# Altium schematic symbol library jlcpcb_2025_04_inductors_extended_0402.schlib: 1396 symbols (part 2 of 8) (continued)
## LQG15HN2N4S02D
designator L?  Inductance: 2.4nH
Inductor, 2.4nH, 100mΩ, 800mA, SMD 0402; Manufacturer: Murata Electronics; Manufacturer Part Number: LQG15HN2N4S02D; Self-Resonant Frequency: 6GHz; Q Factor: 8@100MHz; Package Size: 0402; JLCPCB Basic Part: No; JLCPCB Part Number: C913678; Supplier 1: LCSC; Category: Inductors; Supplier Part Number 1: C913678; Rated Current: 800mA; DC Resistance: 100mΩ; RoHS: Yes; ComponentLink1Description: Datasheet; ComponentLink1URL: https://wmsc.lcsc.com/wmsc/upload/file/pdf/v2/lcsc/2012102243_Murata-Electronics-LQG15HN2N4S02D_C913678.pdf; ComponentLink2Description: JLCPCB Part URL; ComponentLink2URL: https://jlcpcb.com/partdetail/C913678; ComponentLink3Description: LCSC Part URL; ComponentLink3URL: https://lcsc.com/product-detail/Inductors-SMD_Murata-Electronics-Murata-Electronics-LQG15HN2N4S02D_C913678.html
footprint IND-0402 (0402 (1005M) Inductor)
pins: 1, 2

## LQG15HN2N7C02D
designator L?  Inductance: 2.7nH
Inductor, 2.7nH, 100mΩ, 800mA, SMD 0402; Manufacturer: Murata Electronics; Manufacturer Part Number: LQG15HN2N7C02D; Self-Resonant Frequency: 6GHz; Q Factor: 8@100MHz; Package Size: 0402; JLCPCB Basic Part: No; JLCPCB Part Number: C1330739; Supplier 1: LCSC; Category: Inductors; Supplier Part Number 1: C1330739; Rated Current: 800mA; DC Resistance: 100mΩ; RoHS: Yes; ComponentLink1Description: Datasheet; ComponentLink1URL: https://wmsc.lcsc.com/wmsc/upload/file/pdf/v2/lcsc/2304140030_Murata-Electronics-LQG15HN2N7C02D_C1330739.pdf; ComponentLink2Description: JLCPCB Part URL; ComponentLink2URL: https://jlcpcb.com/partdetail/C1330739; ComponentLink3Description: LCSC Part URL; ComponentLink3URL: https://lcsc.com/product-detail/Inductors-SMD_Murata-Electronics-Murata-Electronics-LQG15HN2N7C02D_C1330739.html
footprint IND-0402 (0402 (1005M) Inductor)
pins: 1, 2

## LQG15HN2N7S02D
designator L?  Inductance: 2.7nH
Inductor, 2.7nH, 100mΩ, 800mA, SMD 0402; Manufacturer: Murata Electronics; Manufacturer Part Number: LQG15HN2N7S02D; Self-Resonant Frequency: 6GHz; Q Factor: 8@100MHz; Package Size: 0402; JLCPCB Basic Part: No; JLCPCB Part Number: C113054; Supplier 1: LCSC; Category: Inductors; Supplier Part Number 1: C113054; Rated Current: 800mA; DC Resistance: 100mΩ; RoHS: Yes; ComponentLink1Description: Datasheet; ComponentLink1URL: https://wmsc.lcsc.com/wmsc/upload/file/pdf/v2/lcsc/2304140030_Murata-Electronics-LQG15HN2N7S02D_C113054.pdf; ComponentLink2Description: JLCPCB Part URL; ComponentLink2URL: https://jlcpcb.com/partdetail/C113054; ComponentLink3Description: LCSC Part URL; ComponentLink3URL: https://lcsc.com/product-detail/Inductors-SMD_Murata-Electronics-Murata-Electronics-LQG15HN2N7S02D_C113054.html
footprint IND-0402 (0402 (1005M) Inductor)
pins: 1, 2

## LQG15HN3N0S02D
designator L?  Inductance: 3nH
Inductor, 3nH, 110mΩ, 800mA, SMD 0402; Manufacturer: Murata Electronics; Manufacturer Part Number: LQG15HN3N0S02D; Self-Resonant Frequency: 6GHz; Q Factor: 8@100MHz; Package Size: 0402; JLCPCB Basic Part: No; JLCPCB Part Number: C185483; Supplier 1: LCSC; Category: Inductors; Supplier Part Number 1: C185483; Rated Current: 800mA; DC Resistance: 110mΩ; RoHS: Yes; ComponentLink1Description: Datasheet; ComponentLink1URL: https://wmsc.lcsc.com/wmsc/upload/file/pdf/v2/lcsc/2304140030_Murata-Electronics-LQG15HN3N0S02D_C185483.pdf; ComponentLink2Description: JLCPCB Part URL; ComponentLink2URL: https://jlcpcb.com/partdetail/C185483; ComponentLink3Description: LCSC Part URL; ComponentLink3URL: https://lcsc.com/product-detail/Inductors-SMD_Murata-Electronics-Murata-Electronics-LQG15HN3N0S02D_C185483.html
footprint IND-0402 (0402 (1005M) Inductor)
pins: 1, 2

## LQG15HN3N3C02D
designator L?  Inductance: 3.3nH
Inductor, 3.3nH, 120mΩ, 800mA, SMD 0402; Manufacturer: Murata Electronics; Manufacturer Part Number: LQG15HN3N3C02D; Self-Resonant Frequency: 6GHz; Q Factor: 8@100MHz; Package Size: 0402; JLCPCB Basic Part: No; JLCPCB Part Number: C1330728; Supplier 1: LCSC; Category: Inductors; Supplier Part Number 1: C1330728; Rated Current: 800mA; DC Resistance: 120mΩ; RoHS: Yes; ComponentLink1Description: Datasheet; ComponentLink1URL: https://wmsc.lcsc.com/wmsc/upload/file/pdf/v2/lcsc/2304140030_Murata-Electronics-LQG15HN3N3C02D_C1330728.pdf; ComponentLink2Description: JLCPCB Part URL; ComponentLink2URL: https://jlcpcb.com/partdetail/C1330728; ComponentLink3Description: LCSC Part URL; ComponentLink3URL: https://lcsc.com/product-detail/Inductors-SMD_Murata-Electronics-Murata-Electronics-LQG15HN3N3C02D_C1330728.html
footprint IND-0402 (0402 (1005M) Inductor)
pins: 1, 2

## LQG15HN3N3S02D
designator L?  Inductance: 3.3nH
Inductor, 3.3nH, 120mΩ, 800mA, SMD 0402; Manufacturer: Murata Electronics; Manufacturer Part Number: LQG15HN3N3S02D; Self-Resonant Frequency: 6GHz; Q Factor: 8@100MHz; Package Size: 0402; JLCPCB Basic Part: No; JLCPCB Part Number: C97986; Supplier 1: LCSC; Category: Inductors; Supplier Part Number 1: C97986; Rated Current: 800mA; DC Resistance: 120mΩ; RoHS: Yes; ComponentLink1Description: Datasheet; ComponentLink1URL: https://wmsc.lcsc.com/wmsc/upload/file/pdf/v2/lcsc/2304140030_Murata-Electronics-LQG15HN3N3S02D_C97986.pdf; ComponentLink2Description: JLCPCB Part URL; ComponentLink2URL: https://jlcpcb.com/partdetail/C97986; ComponentLink3Description: LCSC Part URL; ComponentLink3URL: https://lcsc.com/product-detail/Inductors-SMD_Murata-Electronics-Murata-Electronics-LQG15HN3N3S02D_C97986.html
footprint IND-0402 (0402 (1005M) Inductor)
pins: 1, 2

## LQG15HN3N6S02D
designator L?  Inductance: 3.6nH
Inductor, 3.6nH, 130mΩ, 700mA, SMD 0402; Manufacturer: Murata Electronics; Manufacturer Part Number: LQG15HN3N6S02D; Self-Resonant Frequency: 6GHz; Q Factor: 8@100MHz; Package Size: 0402; JLCPCB Basic Part: No; JLCPCB Part Number: C237540; Supplier 1: LCSC; Category: Inductors; Supplier Part Number 1: C237540; Rated Current: 700mA; DC Resistance: 130mΩ; RoHS: Yes; ComponentLink1Description: Datasheet; ComponentLink1URL: https://wmsc.lcsc.com/wmsc/upload/file/pdf/v2/lcsc/1811151149_Murata-Electronics-LQG15HN3N6S02D_C237540.pdf; ComponentLink2Description: JLCPCB Part URL; ComponentLink2URL: https://jlcpcb.com/partdetail/C237540; ComponentLink3Description: LCSC Part URL; ComponentLink3URL: https://lcsc.com/product-detail/Inductors-SMD_Murata-Electronics-Murata-Electronics-LQG15HN3N6S02D_C237540.html
footprint IND-0402 (0402 (1005M) Inductor)
pins: 1, 2

## LQG15HN3N9C02D
designator L?  Inductance: 3.9nH
Inductor, 3.9nH, 130mΩ, 700mA, SMD 0402; Manufacturer: Murata Electronics; Manufacturer Part Number: LQG15HN3N9C02D; Self-Resonant Frequency: 6GHz; Package Size: 0402; JLCPCB Basic Part: No; JLCPCB Part Number: C668380; Supplier 1: LCSC; Category: Inductors; Supplier Part Number 1: C668380; Rated Current: 700mA; DC Resistance: 130mΩ; RoHS: Yes; ComponentLink1Description: Datasheet; ComponentLink1URL: https://wmsc.lcsc.com/wmsc/upload/file/pdf/v2/lcsc/2301041009_Murata-Electronics-LQG15HN3N9C02D_C668380.pdf; ComponentLink2Description: JLCPCB Part URL; ComponentLink2URL: https://jlcpcb.com/partdetail/C668380; ComponentLink3Description: LCSC Part URL; ComponentLink3URL: https://lcsc.com/product-detail/Inductors-SMD_Murata-Electronics-Murata-Electronics-LQG15HN3N9C02D_C668380.html
footprint IND-0402 (0402 (1005M) Inductor)
pins: 1, 2

## LQG15HN3N9S02D
designator L?  Inductance: 3.9nH
Inductor, 3.9nH, 130mΩ, 700mA, SMD 0402; Manufacturer: Murata Electronics; Manufacturer Part Number: LQG15HN3N9S02D; Self-Resonant Frequency: 6GHz; Q Factor: 8@100MHz; Package Size: 0402; JLCPCB Basic Part: No; JLCPCB Part Number: C97987; Supplier 1: LCSC; Category: Inductors; Supplier Part Number 1: C97987; Rated Current: 700mA; DC Resistance: 130mΩ; RoHS: Yes; ComponentLink1Description: Datasheet; ComponentLink1URL: https://wmsc.lcsc.com/wmsc/upload/file/pdf/v2/lcsc/2304140030_Murata-Electronics-LQG15HN3N9S02D_C97987.pdf; ComponentLink2Description: JLCPCB Part URL; ComponentLink2URL: https://jlcpcb.com/partdetail/C97987; ComponentLink3Description: LCSC Part URL; ComponentLink3URL: https://lcsc.com/product-detail/Inductors-SMD_Murata-Electronics-Murata-Electronics-LQG15HN3N9S02D_C97987.html
footprint IND-0402 (0402 (1005M) Inductor)
pins: 1, 2

## LQG15HN4N3S02D
designator L?  Inductance: 4.3nH
Inductor, 4.3nH, 150mΩ, 700mA, SMD 0402; Manufacturer: Murata Electronics; Manufacturer Part Number: LQG15HN4N3S02D; Self-Resonant Frequency: 6GHz; Q Factor: 8@100MHz; Package Size: 0402; JLCPCB Basic Part: No; JLCPCB Part Number: C113056; Supplier 1: LCSC; Category: Inductors; Supplier Part Number 1: C113056; Rated Current: 700mA; DC Resistance: 150mΩ; RoHS: Yes; ComponentLink1Description: Datasheet; ComponentLink1URL: https://wmsc.lcsc.com/wmsc/upload/file/pdf/v2/lcsc/2304140030_Murata-Electronics-LQG15HN4N3S02D_C113056.pdf; ComponentLink2Description: JLCPCB Part URL; ComponentLink2URL: https://jlcpcb.com/partdetail/C113056; ComponentLink3Description: LCSC Part URL; ComponentLink3URL: https://lcsc.com/product-detail/Inductors-SMD_Murata-Electronics-Murata-Electronics-LQG15HN4N3S02D_C113056.html
footprint IND-0402 (0402 (1005M) Inductor)
pins: 1, 2

## LQG15HN4N7C02D
designator L?  Inductance: 4.7nH
Inductor, 4.7nH, 160mΩ, 700mA, SMD 0402; Manufacturer: Murata Electronics; Manufacturer Part Number: LQG15HN4N7C02D; Self-Resonant Frequency: 6GHz; Q Factor: 8@100MHz; Package Size: 0402; JLCPCB Basic Part: No; JLCPCB Part Number: C2046273; Supplier 1: LCSC; Category: Inductors; Supplier Part Number 1: C2046273; Rated Current: 700mA; DC Resistance: 160mΩ; RoHS: Yes; ComponentLink1Description: Datasheet; ComponentLink1URL: https://wmsc.lcsc.com/wmsc/upload/file/pdf/v2/lcsc/2202010300_Murata-Electronics-LQG15HN4N7C02D_C2046273.pdf; ComponentLink2Description: JLCPCB Part URL; ComponentLink2URL: https://jlcpcb.com/partdetail/C2046273; ComponentLink3Description: LCSC Part URL; ComponentLink3URL: https://lcsc.com/product-detail/Inductors-SMD_Murata-Electronics-Murata-Electronics-LQG15HN4N7C02D_C2046273.html
footprint IND-0402 (0402 (1005M) Inductor)
pins: 1, 2

## LQG15HN4N7S02D
designator L?  Inductance: 4.7nH
Inductor, 4.7nH, 160mΩ, 700mA, SMD 0402; Manufacturer: Murata Electronics; Manufacturer Part Number: LQG15HN4N7S02D; Self-Resonant Frequency: 6GHz; Q Factor: 8@100MHz; Package Size: 0402; JLCPCB Basic Part: No; JLCPCB Part Number: C97989; Supplier 1: LCSC; Category: Inductors; Supplier Part Number 1: C97989; Rated Current: 700mA; DC Resistance: 160mΩ; RoHS: Yes; ComponentLink1Description: Datasheet; ComponentLink1URL: https://wmsc.lcsc.com/wmsc/upload/file/pdf/v2/lcsc/2304140030_Murata-Electronics-LQG15HN4N7S02D_C97989.pdf; ComponentLink2Description: JLCPCB Part URL; ComponentLink2URL: https://jlcpcb.com/partdetail/C97989; ComponentLink3Description: LCSC Part URL; ComponentLink3URL: https://lcsc.com/product-detail/Inductors-SMD_Murata-Electronics-Murata-Electronics-LQG15HN4N7S02D_C97989.html
footprint IND-0402 (0402 (1005M) Inductor)
pins: 1, 2

## LQG15HN5N1S02D
designator L?  Inductance: 5.1nH
Inductor, 5.1nH, 160mΩ, 600mA, SMD 0402; Manufacturer: Murata Electronics; Manufacturer Part Number: LQG15HN5N1S02D; Self-Resonant Frequency: 6GHz; Q Factor: 8@100MHz; Package Size: 0402; JLCPCB Basic Part: No; JLCPCB Part Number: C97990; Supplier 1: LCSC; Category: Inductors; Supplier Part Number 1: C97990; Rated Current: 600mA; DC Resistance: 160mΩ; RoHS: Yes; ComponentLink1Description: Datasheet; ComponentLink1URL: https://wmsc.lcsc.com/wmsc/upload/file/pdf/v2/lcsc/2304140030_Murata-Electronics-LQG15HN5N1S02D_C97990.pdf; ComponentLink2Description: JLCPCB Part URL; ComponentLink2URL: https://jlcpcb.com/partdetail/C97990; ComponentLink3Description: LCSC Part URL; ComponentLink3URL: https://lcsc.com/product-detail/Inductors-SMD_Murata-Electronics-Murata-Electronics-LQG15HN5N1S02D_C97990.html
footprint IND-0402 (0402 (1005M) Inductor)
pins: 1, 2

## LQG15HN5N6S02D
designator L?  Inductance: 5.6nH
Inductor, 5.6nH, 180mΩ, 600mA, SMD 0402; Manufacturer: Murata Electronics; Manufacturer Part Number: LQG15HN5N6S02D; Self-Resonant Frequency: 5.3GHz; Q Factor: 8@100MHz; Package Size: 0402; JLCPCB Basic Part: No; JLCPCB Part Number: C97991; Supplier 1: LCSC; Category: Inductors; Supplier Part Number 1: C97991; Rated Current: 600mA; DC Resistance: 180mΩ; RoHS: Yes; ComponentLink1Description: Datasheet; ComponentLink1URL: https://wmsc.lcsc.com/wmsc/upload/file/pdf/v2/lcsc/2304140030_Murata-Electronics-LQG15HN5N6S02D_C97991.pdf; ComponentLink2Description: JLCPCB Part URL; ComponentLink2URL: https://jlcpcb.com/partdetail/C97991; ComponentLink3Description: LCSC Part URL; ComponentLink3URL: https://lcsc.com/product-detail/Inductors-SMD_Murata-Electronics-Murata-Electronics-LQG15HN5N6S02D_C97991.html
footprint IND-0402 (0402 (1005M) Inductor)
pins: 1, 2

## LQG15HN6N2S02D
designator L?  Inductance: 6.2nH
Inductor, 6.2nH, 190mΩ, 600mA, SMD 0402; Manufacturer: Murata Electronics; Manufacturer Part Number: LQG15HN6N2S02D; Self-Resonant Frequency: 4.3GHz; Q Factor: 8@100MHz; Package Size: 0402; JLCPCB Basic Part: No; JLCPCB Part Number: C341763; Supplier 1: LCSC; Category: Inductors; Supplier Part Number 1: C341763; Rated Current: 600mA; DC Resistance: 190mΩ; RoHS: Yes; ComponentLink1Description: Datasheet; ComponentLink1URL: https://wmsc.lcsc.com/wmsc/upload/file/pdf/v2/lcsc/2304140030_Murata-Electronics-LQG15HN6N2S02D_C341763.pdf; ComponentLink2Description: JLCPCB Part URL; ComponentLink2URL: https://jlcpcb.com/partdetail/C341763; ComponentLink3Description: LCSC Part URL; ComponentLink3URL: https://lcsc.com/product-detail/Inductors-SMD_Murata-Electronics-Murata-Electronics-LQG15HN6N2S02D_C341763.html
footprint IND-0402 (0402 (1005M) Inductor)
pins: 1, 2

## LQG15HN6N8J02D
designator L?  Inductance: 6.8nH
Inductor, 6.8nH, ±5%, 210mΩ, 600mA, SMD 0402; Manufacturer: Murata Electronics; Manufacturer Part Number: LQG15HN6N8J02D; Self-Resonant Frequency: 4.2GHz; Q Factor: 8@100MHz; Package Size: 0402; JLCPCB Basic Part: No; JLCPCB Part Number: C84403; Supplier 1: LCSC; Category: Inductors; Supplier Part Number 1: C84403; Tolerance: ±5%; Rated Current: 600mA; DC Resistance: 210mΩ; RoHS: Yes; ComponentLink1Description: Datasheet; ComponentLink1URL: https://wmsc.lcsc.com/wmsc/upload/file/pdf/v2/lcsc/2304140030_Murata-Electronics-LQG15HN6N8J02D_C84403.pdf; ComponentLink2Description: JLCPCB Part URL; ComponentLink2URL: https://jlcpcb.com/partdetail/C84403; ComponentLink3Description: LCSC Part URL; ComponentLink3URL: https://lcsc.com/product-detail/Inductors-SMD_Murata-Electronics-Murata-Electronics-LQG15HN6N8J02D_C84403.html
footprint IND-0402 (0402 (1005M) Inductor)
pins: 1, 2

## LQG15HN8N2J02D
designator L?  Inductance: 8.2nH
Inductor, 8.2nH, ±5%, 250mΩ, 500mA, SMD 0402; Manufacturer: Murata Electronics; Manufacturer Part Number: LQG15HN8N2J02D; Self-Resonant Frequency: 3.6GHz; Q Factor: 8@100MHz; Package Size: 0402; JLCPCB Basic Part: No; JLCPCB Part Number: C97994; Supplier 1: LCSC; Category: Inductors; Supplier Part Number 1: C97994; Tolerance: ±5%; Rated Current: 500mA; DC Resistance: 250mΩ; RoHS: Yes; ComponentLink1Description: Datasheet; ComponentLink1URL: https://wmsc.lcsc.com/wmsc/upload/file/pdf/v2/lcsc/2304140030_Murata-Electronics-LQG15HN8N2J02D_C97994.pdf; ComponentLink2Description: JLCPCB Part URL; ComponentLink2URL: https://jlcpcb.com/partdetail/C97994; ComponentLink3Description: LCSC Part URL; ComponentLink3URL: https://lcsc.com/product-detail/Inductors-SMD_Murata-Electronics-Murata-Electronics-LQG15HN8N2J02D_C97994.html
footprint IND-0402 (0402 (1005M) Inductor)
pins: 1, 2

## LQG15HN9N1H02D
designator L?  Inductance: 9.1nH
Inductor, 9.1nH, ±3%, 270mΩ, 500mA, SMD 0402; Manufacturer: Murata Electronics; Manufacturer Part Number: LQG15HN9N1H02D; Self-Resonant Frequency: 3.4GHz; Q Factor: 8@100MHz; Package Size: 0402; JLCPCB Basic Part: No; JLCPCB Part Number: C1330489; Supplier 1: LCSC; Category: Inductors; Supplier Part Number 1: C1330489; Tolerance: ±3%; Rated Current: 500mA; DC Resistance: 270mΩ; RoHS: Yes; ComponentLink1Description: Datasheet; ComponentLink1URL: https://wmsc.lcsc.com/wmsc/upload/file/pdf/v2/lcsc/2304140030_Murata-Electronics-LQG15HN9N1H02D_C1330489.pdf; ComponentLink2Description: JLCPCB Part URL; ComponentLink2URL: https://jlcpcb.com/partdetail/C1330489; ComponentLink3Description: LCSC Part URL; ComponentLink3URL: https://lcsc.com/product-detail/Inductors-SMD_Murata-Electronics-Murata-Electronics-LQG15HN9N1H02D_C1330489.html
footprint IND-0402 (0402 (1005M) Inductor)
pins: 1, 2

## LQG15HN9N1J02D
designator L?  Inductance: 9.1nH
Inductor, 9.1nH, ±5%, 270mΩ, 500mA, SMD 0402; Manufacturer: Murata Electronics; Manufacturer Part Number: LQG15HN9N1J02D; Self-Resonant Frequency: 3.4GHz; Q Factor: 8@100MHz; Package Size: 0402; JLCPCB Basic Part: No; JLCPCB Part Number: C113059; Supplier 1: LCSC; Category: Inductors; Supplier Part Number 1: C113059; Tolerance: ±5%; Rated Current: 500mA; DC Resistance: 270mΩ; RoHS: Yes; ComponentLink1Description: Datasheet; ComponentLink1URL: https://wmsc.lcsc.com/wmsc/upload/file/pdf/v2/lcsc/2304140030_Murata-Electronics-LQG15HN9N1J02D_C113059.pdf; ComponentLink2Description: JLCPCB Part URL; ComponentLink2URL: https://jlcpcb.com/partdetail/C113059; ComponentLink3Description: LCSC Part URL; ComponentLink3URL: https://lcsc.com/product-detail/Inductors-SMD_Murata-Electronics-Murata-Electronics-LQG15HN9N1J02D_C113059.html
footprint IND-0402 (0402 (1005M) Inductor)
pins: 1, 2

## LQG15HN10NH02D
designator L?  Inductance: 10nH
Inductor, 10nH, ±3%, 290mΩ, 500mA, SMD 0402; Manufacturer: Murata Electronics; Manufacturer Part Number: LQG15HN10NH02D; Self-Resonant Frequency: 3.2GHz; Q Factor: 8@100MHz; Package Size: 0402; JLCPCB Basic Part: No; JLCPCB Part Number: C2044397; Supplier 1: LCSC; Category: Inductors; Supplier Part Number 1: C2044397; Tolerance: ±3%; Rated Current: 500mA; DC Resistance: 290mΩ; RoHS: Yes; ComponentLink1Description: Datasheet; ComponentLink1URL: https://wmsc.lcsc.com/wmsc/upload/file/pdf/v2/lcsc/2304140030_Murata-Electronics-LQG15HN10NH02D_C2044397.pdf; ComponentLink2Description: JLCPCB Part URL; ComponentLink2URL: https://jlcpcb.com/partdetail/C2044397; ComponentLink3Description: LCSC Part URL; ComponentLink3URL: https://lcsc.com/product-detail/Inductors-SMD_Murata-Electronics-Murata-Electronics-LQG15HN10NH02D_C2044397.html
footprint IND-0402 (0402 (1005M) Inductor)
pins: 1, 2

## LQG15HN10NJ02D
designator L?  Inductance: 10nH
Inductor, 10nH, ±5%, 290mΩ, 500mA, SMD 0402; Manufacturer: Murata Electronics; Manufacturer Part Number: LQG15HN10NJ02D; Self-Resonant Frequency: 3.2GHz; Q Factor: 8@100MHz; Package Size: 0402; JLCPCB Basic Part: No; JLCPCB Part Number: C21585; Supplier 1: LCSC; Category: Inductors; Supplier Part Number 1: C21585; Tolerance: ±5%; Rated Current: 500mA; DC Resistance: 290mΩ; RoHS: Yes; ComponentLink1Description: Datasheet; ComponentLink1URL: https://wmsc.lcsc.com/wmsc/upload/file/pdf/v2/lcsc/2304140030_Murata-Electronics-LQG15HN10NJ02D_C21585.pdf; ComponentLink2Description: JLCPCB Part URL; ComponentLink2URL: https://jlcpcb.com/partdetail/C21585; ComponentLink3Description: LCSC Part URL; ComponentLink3URL: https://lcsc.com/product-detail/Inductors-SMD_Murata-Electronics-Murata-Electronics-LQG15HN10NJ02D_C21585.html
footprint IND-0402 (0402 (1005M) Inductor)
pins: 1, 2

## LQG15HN12NJ02D
designator L?  Inductance: 12nH
Inductor, 12nH, ±5%, 400mΩ, 400mA, SMD 0402; Manufacturer: Murata Electronics; Manufacturer Part Number: LQG15HN12NJ02D; Self-Resonant Frequency: 2.8GHz; Q Factor: 8@100MHz; Package Size: 0402; JLCPCB Basic Part: No; JLCPCB Part Number: C113052; Supplier 1: LCSC; Category: Inductors; Supplier Part Number 1: C113052; Tolerance: ±5%; Rated Current: 400mA; DC Resistance: 400mΩ; RoHS: Yes; ComponentLink1Description: Datasheet; ComponentLink1URL: https://wmsc.lcsc.com/wmsc/upload/file/pdf/v2/lcsc/2304140030_Murata-Electronics-LQG15HN12NJ02D_C113052.pdf; ComponentLink2Description: JLCPCB Part URL; ComponentLink2URL: https://jlcpcb.com/partdetail/C113052; ComponentLink3Description: LCSC Part URL; ComponentLink3URL: https://lcsc.com/product-detail/Inductors-SMD_Murata-Electronics-Murata-Electronics-LQG15HN12NJ02D_C113052.html
footprint IND-0402 (0402 (1005M) Inductor)
pins: 1, 2

## LQG15HN15NJ02D
designator L?  Inductance: 15nH
Inductor, 15nH, ±5%, 450mΩ, 400mA, SMD 0402; Manufacturer: Murata Electronics; Manufacturer Part Number: LQG15HN15NJ02D; Self-Resonant Frequency: 2.3GHz; Q Factor: 8@100MHz; Package Size: 0402; JLCPCB Basic Part: No; JLCPCB Part Number: C97979; Supplier 1: LCSC; Category: Inductors; Supplier Part Number 1: C97979; Tolerance: ±5%; Rated Current: 400mA; DC Resistance: 450mΩ; RoHS: Yes; ComponentLink1Description: Datasheet; ComponentLink1URL: https://wmsc.lcsc.com/wmsc/upload/file/pdf/v2/lcsc/2304140030_Murata-Electronics-LQG15HN15NJ02D_C97979.pdf; ComponentLink2Description: JLCPCB Part URL; ComponentLink2URL: https://jlcpcb.com/partdetail/C97979; ComponentLink3Description: LCSC Part URL; ComponentLink3URL: https://lcsc.com/product-detail/Inductors-SMD_Murata-Electronics-Murata-Electronics-LQG15HN15NJ02D_C97979.html
footprint IND-0402 (0402 (1005M) Inductor)
pins: 1, 2

## LQG15HN18NJ02D
designator L?  Inductance: 18nH
Inductor, 18nH, ±5%, 510mΩ, 350mA, SMD 0402; Manufacturer: Murata Electronics; Manufacturer Part Number: LQG15HN18NJ02D; Self-Resonant Frequency: 2.1GHz; Q Factor: 8@100MHz; Package Size: 0402; JLCPCB Basic Part: No; JLCPCB Part Number: C97980; Supplier 1: LCSC; Category: Inductors; Supplier Part Number 1: C97980; Tolerance: ±5%; Rated Current: 350mA; DC Resistance: 510mΩ; RoHS: Yes; ComponentLink1Description: Datasheet; ComponentLink1URL: https://wmsc.lcsc.com/wmsc/upload/file/pdf/v2/lcsc/2304140030_Murata-Electronics-LQG15HN18NJ02D_C97980.pdf; ComponentLink2Description: JLCPCB Part URL; ComponentLink2URL: https://jlcpcb.com/partdetail/C97980; ComponentLink3Description: LCSC Part URL; ComponentLink3URL: https://lcsc.com/product-detail/Inductors-SMD_Murata-Electronics-Murata-Electronics-LQG15HN18NJ02D_C97980.html
footprint IND-0402 (0402 (1005M) Inductor)
pins: 1, 2

## LQG15HN22NH02D
designator L?  Inductance: 22nH
Inductor, 22nH, ±3%, 580mΩ, 350mA, SMD 0402; Manufacturer: Murata Electronics; Manufacturer Part Number: LQG15HN22NH02D; Self-Resonant Frequency: 1.8GHz; Package Size: 0402; JLCPCB Basic Part: No; JLCPCB Part Number: C3911139; Supplier 1: LCSC; Category: Inductors; Supplier Part Number 1: C3911139; Tolerance: ±3%; Rated Current: 350mA; DC Resistance: 580mΩ; RoHS: Yes; ComponentLink1Description: Datasheet; ComponentLink1URL: https://wmsc.lcsc.com/wmsc/upload/file/pdf/v2/lcsc/2308111426_Murata-Electronics-LQG15HN22NH02D_C3911139.pdf; ComponentLink2Description: JLCPCB Part URL; ComponentLink2URL: https://jlcpcb.com/partdetail/C3911139; ComponentLink3Description: LCSC Part URL; ComponentLink3URL: https://lcsc.com/product-detail/Inductors-SMD_Murata-Electronics-Murata-Electronics-LQG15HN22NH02D_C3911139.html
footprint IND-0402 (0402 (1005M) Inductor)
pins: 1, 2

## LQG15HN22NJ02D
designator L?  Inductance: 22nH
Inductor, 22nH, ±5%, 580mΩ, 350mA, SMD 0402; Manufacturer: Murata Electronics; Manufacturer Part Number: LQG15HN22NJ02D; Self-Resonant Frequency: 1.8GHz; Q Factor: 8@100MHz; Package Size: 0402; JLCPCB Basic Part: No; JLCPCB Part Number: C97983; Supplier 1: LCSC; Category: Inductors; Supplier Part Number 1: C97983; Tolerance: ±5%; Rated Current: 350mA; DC Resistance: 580mΩ; RoHS: Yes; ComponentLink1Description: Datasheet; ComponentLink1URL: https://wmsc.lcsc.com/wmsc/upload/file/pdf/v2/lcsc/2304140030_Murata-Electronics-LQG15HN22NJ02D_C97983.pdf; ComponentLink2Description: JLCPCB Part URL; ComponentLink2URL: https://jlcpcb.com/partdetail/C97983; ComponentLink3Description: LCSC Part URL; ComponentLink3URL: https://lcsc.com/product-detail/Inductors-SMD_Murata-Electronics-Murata-Electronics-LQG15HN22NJ02D_C97983.html
footprint IND-0402 (0402 (1005M) Inductor)
pins: 1, 2

## LQG15HN27NJ02D
designator L?  Inductance: 27nH
Inductor, 27nH, ±5%, 670mΩ, 300mA, SMD 0402; Manufacturer: Murata Electronics; Manufacturer Part Number: LQG15HN27NJ02D; Self-Resonant Frequency: 1.6GHz; Q Factor: 8@100MHz; Package Size: 0402; JLCPCB Basic Part: No; JLCPCB Part Number: C115488; Supplier 1: LCSC; Category: Inductors; Supplier Part Number 1: C115488; Tolerance: ±5%; Rated Current: 300mA; DC Resistance: 670mΩ; RoHS: Yes; ComponentLink1Description: Datasheet; ComponentLink1URL: https://wmsc.lcsc.com/wmsc/upload/file/pdf/v2/lcsc/2304140030_Murata-Electronics-LQG15HN27NJ02D_C115488.pdf; ComponentLink2Description: JLCPCB Part URL; ComponentLink2URL: https://jlcpcb.com/partdetail/C115488; ComponentLink3Description: LCSC Part URL; ComponentLink3URL: https://lcsc.com/product-detail/Inductors-SMD_Murata-Electronics-Murata-Electronics-LQG15HN27NJ02D_C115488.html
footprint IND-0402 (0402 (1005M) Inductor)
pins: 1, 2

## LQG15HN33NJ02D
designator L?  Inductance: 33nH
Inductor, 33nH, ±5%, 670mΩ, 300mA, SMD 0402; Manufacturer: Murata Electronics; Manufacturer Part Number: LQG15HN33NJ02D; Self-Resonant Frequency: 1.5GHz; Q Factor: 8@100MHz; Package Size: 0402; JLCPCB Basic Part: No; JLCPCB Part Number: C84398; Supplier 1: LCSC; Category: Inductors; Supplier Part Number 1: C84398; Tolerance: ±5%; Rated Current: 300mA; DC Resistance: 670mΩ; RoHS: Yes; ComponentLink1Description: Datasheet; ComponentLink1URL: https://wmsc.lcsc.com/wmsc/upload/file/pdf/v2/lcsc/1811081532_Murata-Electronics-LQG15HN33NJ02D_C84398.pdf; ComponentLink2Description: JLCPCB Part URL; ComponentLink2URL: https://jlcpcb.com/partdetail/C84398; ComponentLink3Description: LCSC Part URL; ComponentLink3URL: https://lcsc.com/product-detail/Inductors-SMD_Murata-Electronics-Murata-Electronics-LQG15HN33NJ02D_C84398.html
footprint IND-0402 (0402 (1005M) Inductor)
pins: 1, 2

## LQG15HN39NJ02D
designator L?  Inductance: 39nH
Inductor, 39nH, ±5%, 1.06Ω, 250mA, SMD 0402; Manufacturer: Murata Electronics; Manufacturer Part Number: LQG15HN39NJ02D; Self-Resonant Frequency: 1.2GHz; Q Factor: 8@100MHz; Package Size: 0402; JLCPCB Basic Part: No; JLCPCB Part Number: C113055; Supplier 1: LCSC; Category: Inductors; Supplier Part Number 1: C113055; Tolerance: ±5%; Rated Current: 250mA; DC Resistance: 1.06Ω; RoHS: Yes; ComponentLink1Description: Datasheet; ComponentLink1URL: https://wmsc.lcsc.com/wmsc/upload/file/pdf/v2/lcsc/2304140030_Murata-Electronics-LQG15HN39NJ02D_C113055.pdf; ComponentLink2Description: JLCPCB Part URL; ComponentLink2URL: https://jlcpcb.com/partdetail/C113055; ComponentLink3Description: LCSC Part URL; ComponentLink3URL: https://lcsc.com/product-detail/Inductors-SMD_Murata-Electronics-Murata-Electronics-LQG15HN39NJ02D_C113055.html
footprint IND-0402 (0402 (1005M) Inductor)
pins: 1, 2

## LQG15HN47NH02D
designator L?  Inductance: 47nH
Inductor, 47nH, ±3%, 1.15Ω, 250mA, SMD 0402; Manufacturer: Murata Electronics; Manufacturer Part Number: LQG15HN47NH02D; Self-Resonant Frequency: 1GHz; Q Factor: 8@100MHz; Package Size: 0402; JLCPCB Basic Part: No; JLCPCB Part Number: C1329407; Supplier 1: LCSC; Category: Inductors; Supplier Part Number 1: C1329407; Tolerance: ±3%; Rated Current: 250mA; DC Resistance: 1.15Ω; RoHS: Yes; ComponentLink1Description: Datasheet; ComponentLink1URL: https://wmsc.lcsc.com/wmsc/upload/file/pdf/v2/lcsc/2304140030_Murata-Electronics-LQG15HN47NH02D_C1329407.pdf; ComponentLink2Description: JLCPCB Part URL; ComponentLink2URL: https://jlcpcb.com/partdetail/C1329407; ComponentLink3Description: LCSC Part URL; ComponentLink3URL: https://lcsc.com/product-detail/Inductors-SMD_Murata-Electronics-Murata-Electronics-LQG15HN47NH02D_C1329407.html
footprint IND-0402 (0402 (1005M) Inductor)
pins: 1, 2

## LQG15HN47NJ02D
designator L?  Inductance: 47nH
Inductor, 47nH, ±5%, 1.15Ω, 250mA, SMD 0402; Manufacturer: Murata Electronics; Manufacturer Part Number: LQG15HN47NJ02D; Self-Resonant Frequency: 1GHz; Q Factor: 8@100MHz; Package Size: 0402; JLCPCB Basic Part: No; JLCPCB Part Number: C97988; Supplier 1: LCSC; Category: Inductors; Supplier Part Number 1: C97988; Tolerance: ±5%; Rated Current: 250mA; DC Resistance: 1.15Ω; RoHS: Yes; ComponentLink1Description: Datasheet; ComponentLink1URL: https://wmsc.lcsc.com/wmsc/upload/file/pdf/v2/lcsc/2304140030_Murata-Electronics-LQG15HN47NJ02D_C97988.pdf; ComponentLink2Description: JLCPCB Part URL; ComponentLink2URL: https://jlcpcb.com/partdetail/C97988; ComponentLink3Description: LCSC Part URL; ComponentLink3URL: https://lcsc.com/product-detail/Inductors-SMD_Murata-Electronics-Murata-Electronics-LQG15HN47NJ02D_C97988.html
footprint IND-0402 (0402 (1005M) Inductor)
pins: 1, 2

## LQG15HN56NJ02D
designator L?  Inductance: 56nH
Inductor, 56nH, ±5%, 1.2Ω, 200mA, SMD 0402; Manufacturer: Murata Electronics; Manufacturer Part Number: LQG15HN56NJ02D; Self-Resonant Frequency: 800MHz; Q Factor: 8@100MHz; Package Size: 0402; JLCPCB Basic Part: No; JLCPCB Part Number: C113057; Supplier 1: LCSC; Category: Inductors; Supplier Part Number 1: C113057; Tolerance: ±5%; Rated Current: 200mA; DC Resistance: 1.2Ω; RoHS: Yes; ComponentLink1Description: Datasheet; ComponentLink1URL: https://wmsc.lcsc.com/wmsc/upload/file/pdf/v2/lcsc/2304140030_Murata-Electronics-LQG15HN56NJ02D_C113057.pdf; ComponentLink2Description: JLCPCB Part URL; ComponentLink2URL: https://jlcpcb.com/partdetail/C113057; ComponentLink3Description: LCSC Part URL; ComponentLink3URL: https://lcsc.com/product-detail/Inductors-SMD_Murata-Electronics-Murata-Electronics-LQG15HN56NJ02D_C113057.html
footprint IND-0402 (0402 (1005M) Inductor)
pins: 1, 2

## LQG15HN68NJ02D
designator L?  Inductance: 68nH
Inductor, 68nH, ±5%, 1.25Ω, 200mA, SMD 0402; Manufacturer: Murata Electronics; Manufacturer Part Number: LQG15HN68NJ02D; Self-Resonant Frequency: 800MHz; Q Factor: 8@100MHz; Package Size: 0402; JLCPCB Basic Part: No; JLCPCB Part Number: C97992; Supplier 1: LCSC; Category: Inductors; Supplier Part Number 1: C97992; Tolerance: ±5%; Rated Current: 200mA; DC Resistance: 1.25Ω; RoHS: Yes; ComponentLink1Description: Datasheet; ComponentLink1URL: https://wmsc.lcsc.com/wmsc/upload/file/pdf/v2/lcsc/2304140030_Murata-Electronics-LQG15HN68NJ02D_C97992.pdf; ComponentLink2Description: JLCPCB Part URL; ComponentLink2URL: https://jlcpcb.com/partdetail/C97992; ComponentLink3Description: LCSC Part URL; ComponentLink3URL: https://lcsc.com/product-detail/Inductors-SMD_Murata-Electronics-Murata-Electronics-LQG15HN68NJ02D_C97992.html
footprint IND-0402 (0402 (1005M) Inductor)
pins: 1, 2

## LQG15HN82NJ02D
designator L?  Inductance: 82nH
Inductor, 82nH, ±5%, 1.6Ω, 200mA, SMD 0402; Manufacturer: Murata Electronics; Manufacturer Part Number: LQG15HN82NJ02D; Self-Resonant Frequency: 600MHz; Q Factor: 8@100MHz; Package Size: 0402; JLCPCB Basic Part: No; JLCPCB Part Number: C113058; Supplier 1: LCSC; Category: Inductors; Supplier Part Number 1: C113058; Tolerance: ±5%; Rated Current: 200mA; DC Resistance: 1.6Ω; RoHS: Yes; ComponentLink1Description: Datasheet; ComponentLink1URL: https://wmsc.lcsc.com/wmsc/upload/file/pdf/v2/lcsc/2304140030_Murata-Electronics-LQG15HN82NJ02D_C113058.pdf; ComponentLink2Description: JLCPCB Part URL; ComponentLink2URL: https://jlcpcb.com/partdetail/C113058; ComponentLink3Description: LCSC Part URL; ComponentLink3URL: https://lcsc.com/product-detail/Inductors-SMD_Murata-Electronics-Murata-Electronics-LQG15HN82NJ02D_C113058.html
footprint IND-0402 (0402 (1005M) Inductor)
pins: 1, 2

## LQG15HNR10J02D
designator L?  Inductance: 100nH
Inductor, 100nH, ±5%, 1.6Ω, 200mA, SMD 0402; Manufacturer: Murata Electronics; Manufacturer Part Number: LQG15HNR10J02D; Self-Resonant Frequency: 600MHz; Q Factor: 8@100MHz; Package Size: 0402; JLCPCB Basic Part: No; JLCPCB Part Number: C97995; Supplier 1: LCSC; Category: Inductors; Supplier Part Number 1: C97995; Tolerance: ±5%; Rated Current: 200mA; DC Resistance: 1.6Ω; RoHS: Yes; ComponentLink1Description: Datasheet; ComponentLink1URL: https://wmsc.lcsc.com/wmsc/upload/file/pdf/v2/lcsc/2304140030_Murata-Electronics-LQG15HNR10J02D_C97995.pdf; ComponentLink2Description: JLCPCB Part URL; ComponentLink2URL: https://jlcpcb.com/partdetail/C97995; ComponentLink3Description: LCSC Part URL; ComponentLink3URL: https://lcsc.com/product-detail/Inductors-SMD_Murata-Electronics-Murata-Electronics-LQG15HNR10J02D_C97995.html
footprint IND-0402 (0402 (1005M) Inductor)
pins: 1, 2

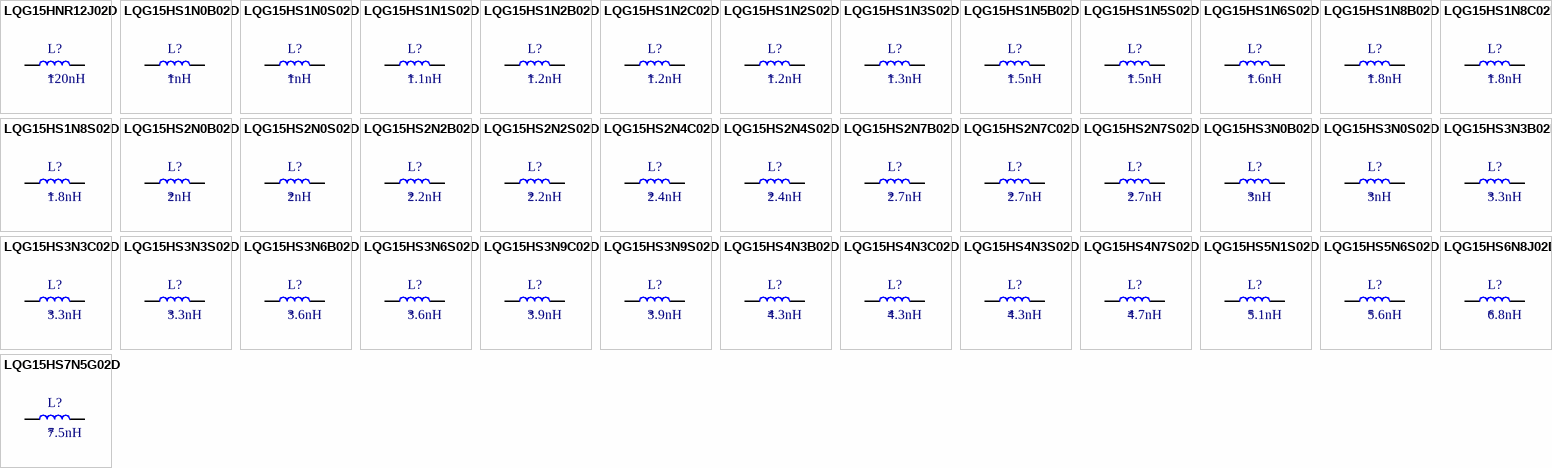
[diagram p9: symbols LQG15HNR12J02D to LQG15HS7N5G02D]

## LQG15HNR12J02D
designator L?  Inductance: 120nH
Inductor, 120nH, ±5%, 1.6Ω, 150mA, SMD 0402; Manufacturer: Murata Electronics; Manufacturer Part Number: LQG15HNR12J02D; Self-Resonant Frequency: 600MHz; Q Factor: 8@100MHz; Package Size: 0402; JLCPCB Basic Part: No; JLCPCB Part Number: C113060; Supplier 1: LCSC; Category: Inductors; Supplier Part Number 1: C113060; Tolerance: ±5%; Rated Current: 150mA; DC Resistance: 1.6Ω; RoHS: Yes; ComponentLink1Description: Datasheet; ComponentLink1URL: https://wmsc.lcsc.com/wmsc/upload/file/pdf/v2/lcsc/1811081514_Murata-Electronics-LQG15HNR12J02D_C113060.pdf; ComponentLink2Description: JLCPCB Part URL; ComponentLink2URL: https://jlcpcb.com/partdetail/C113060; ComponentLink3Description: LCSC Part URL; ComponentLink3URL: https://lcsc.com/product-detail/Inductors-SMD_Murata-Electronics-Murata-Electronics-LQG15HNR12J02D_C113060.html
footprint IND-0402 (0402 (1005M) Inductor)
pins: 1, 2

## LQG15HS1N0B02D
designator L?  Inductance: 1nH
Inductor, 1nH, 70mΩ, 1A, SMD 0402; Manufacturer: Murata Electronics; Manufacturer Part Number: LQG15HS1N0B02D; Self-Resonant Frequency: 10GHz; Q Factor: 8@100MHz; Package Size: 0402; JLCPCB Basic Part: No; JLCPCB Part Number: C162538; Supplier 1: LCSC; Category: Inductors; Supplier Part Number 1: C162538; Rated Current: 1A; DC Resistance: 70mΩ; RoHS: Yes; ComponentLink1Description: Datasheet; ComponentLink1URL: https://wmsc.lcsc.com/wmsc/upload/file/pdf/v2/lcsc/2304140030_Murata-Electronics-LQG15HS1N0B02D_C162538.pdf; ComponentLink2Description: JLCPCB Part URL; ComponentLink2URL: https://jlcpcb.com/partdetail/C162538; ComponentLink3Description: LCSC Part URL; ComponentLink3URL: https://lcsc.com/product-detail/Inductors-SMD_Murata-Electronics-Murata-Electronics-LQG15HS1N0B02D_C162538.html
footprint IND-0402 (0402 (1005M) Inductor)
pins: 1, 2

## LQG15HS1N0S02D
designator L?  Inductance: 1nH
Inductor, 1nH, 70mΩ, 1A, SMD 0402; Manufacturer: Murata Electronics; Manufacturer Part Number: LQG15HS1N0S02D; Self-Resonant Frequency: 10GHz; Q Factor: 8@100MHz; Package Size: 0402; JLCPCB Basic Part: No; JLCPCB Part Number: C18222; Supplier 1: LCSC; Category: Inductors; Supplier Part Number 1: C18222; Rated Current: 1A; DC Resistance: 70mΩ; RoHS: Yes; ComponentLink1Description: Datasheet; ComponentLink1URL: https://wmsc.lcsc.com/wmsc/upload/file/pdf/v2/lcsc/1810232007_Murata-Electronics-LQG15HS1N0S02D_C18222.pdf; ComponentLink2Description: JLCPCB Part URL; ComponentLink2URL: https://jlcpcb.com/partdetail/C18222; ComponentLink3Description: LCSC Part URL; ComponentLink3URL: https://lcsc.com/product-detail/Inductors-SMD_Murata-Electronics-Murata-Electronics-LQG15HS1N0S02D_C18222.html
footprint IND-0402 (0402 (1005M) Inductor)
pins: 1, 2

## LQG15HS1N1S02D
designator L?  Inductance: 1.1nH
Inductor, 1.1nH, 70mΩ, 1A, SMD 0402; Manufacturer: Murata Electronics; Manufacturer Part Number: LQG15HS1N1S02D; Self-Resonant Frequency: 6GHz; Q Factor: 8@100MHz; Package Size: 0402; JLCPCB Basic Part: No; JLCPCB Part Number: C18217; Supplier 1: LCSC; Category: Inductors; Supplier Part Number 1: C18217; Rated Current: 1A; DC Resistance: 70mΩ; RoHS: Yes; ComponentLink1Description: Datasheet; ComponentLink1URL: https://wmsc.lcsc.com/wmsc/upload/file/pdf/v2/lcsc/2304140030_Murata-Electronics-LQG15HS1N1S02D_C18217.pdf; ComponentLink2Description: JLCPCB Part URL; ComponentLink2URL: https://jlcpcb.com/partdetail/C18217; ComponentLink3Description: LCSC Part URL; ComponentLink3URL: https://lcsc.com/product-detail/Inductors-SMD_Murata-Electronics-Murata-Electronics-LQG15HS1N1S02D_C18217.html
footprint IND-0402 (0402 (1005M) Inductor)
pins: 1, 2

## LQG15HS1N2B02D
designator L?  Inductance: 1.2nH
Inductor, 1.2nH, 70mΩ, 1A, SMD 0402; Manufacturer: Murata Electronics; Manufacturer Part Number: LQG15HS1N2B02D; Self-Resonant Frequency: 6GHz; Q Factor: 8@100MHz; Package Size: 0402; JLCPCB Basic Part: No; JLCPCB Part Number: C488336; Supplier 1: LCSC; Category: Inductors; Supplier Part Number 1: C488336; Rated Current: 1A; DC Resistance: 70mΩ; RoHS: Yes; ComponentLink1Description: Datasheet; ComponentLink1URL: https://wmsc.lcsc.com/wmsc/upload/file/pdf/v2/lcsc/2304140030_Murata-Electronics-LQG15HS1N2B02D_C488336.pdf; ComponentLink2Description: JLCPCB Part URL; ComponentLink2URL: https://jlcpcb.com/partdetail/C488336; ComponentLink3Description: LCSC Part URL; ComponentLink3URL: https://lcsc.com/product-detail/Inductors-SMD_Murata-Electronics-Murata-Electronics-LQG15HS1N2B02D_C488336.html
footprint IND-0402 (0402 (1005M) Inductor)
pins: 1, 2

## LQG15HS1N2C02D
designator L?  Inductance: 1.2nH
Inductor, 1.2nH, 70mΩ, 1A, SMD 0402; Manufacturer: Murata Electronics; Manufacturer Part Number: LQG15HS1N2C02D; Self-Resonant Frequency: 6GHz; Q Factor: 8@100MHz; Package Size: 0402; JLCPCB Basic Part: No; JLCPCB Part Number: C2043447; Supplier 1: LCSC; Category: Inductors; Supplier Part Number 1: C2043447; Rated Current: 1A; DC Resistance: 70mΩ; RoHS: Yes; ComponentLink1Description: Datasheet; ComponentLink1URL: https://wmsc.lcsc.com/wmsc/upload/file/pdf/v2/lcsc/2304140030_Murata-Electronics-LQG15HS1N2C02D_C2043447.pdf; ComponentLink2Description: JLCPCB Part URL; ComponentLink2URL: https://jlcpcb.com/partdetail/C2043447; ComponentLink3Description: LCSC Part URL; ComponentLink3URL: https://lcsc.com/product-detail/Inductors-SMD_Murata-Electronics-Murata-Electronics-LQG15HS1N2C02D_C2043447.html
footprint IND-0402 (0402 (1005M) Inductor)
pins: 1, 2

## LQG15HS1N2S02D
designator L?  Inductance: 1.2nH
Inductor, 1.2nH, 70mΩ, 1A, SMD 0402; Manufacturer: Murata Electronics; Manufacturer Part Number: LQG15HS1N2S02D; Self-Resonant Frequency: 6GHz; Q Factor: 8@100MHz; Package Size: 0402; JLCPCB Basic Part: No; JLCPCB Part Number: C77105; Supplier 1: LCSC; Category: Inductors; Supplier Part Number 1: C77105; Rated Current: 1A; DC Resistance: 70mΩ; RoHS: Yes; ComponentLink1Description: Datasheet; ComponentLink1URL: https://wmsc.lcsc.com/wmsc/upload/file/pdf/v2/lcsc/2304140030_Murata-Electronics-LQG15HS1N2S02D_C77105.pdf; ComponentLink2Description: JLCPCB Part URL; ComponentLink2URL: https://jlcpcb.com/partdetail/C77105; ComponentLink3Description: LCSC Part URL; ComponentLink3URL: https://lcsc.com/product-detail/Inductors-SMD_Murata-Electronics-Murata-Electronics-LQG15HS1N2S02D_C77105.html
footprint IND-0402 (0402 (1005M) Inductor)
pins: 1, 2

## LQG15HS1N3S02D
designator L?  Inductance: 1.3nH
Inductor, 1.3nH, 70mΩ, 1A, SMD 0402; Manufacturer: Murata Electronics; Manufacturer Part Number: LQG15HS1N3S02D; Self-Resonant Frequency: 6GHz; Q Factor: 8@100MHz; Package Size: 0402; JLCPCB Basic Part: No; JLCPCB Part Number: C97996; Supplier 1: LCSC; Category: Inductors; Supplier Part Number 1: C97996; Rated Current: 1A; DC Resistance: 70mΩ; RoHS: Yes; ComponentLink1Description: Datasheet; ComponentLink1URL: https://wmsc.lcsc.com/wmsc/upload/file/pdf/v2/lcsc/2304140030_Murata-Electronics-LQG15HS1N3S02D_C97996.pdf; ComponentLink2Description: JLCPCB Part URL; ComponentLink2URL: https://jlcpcb.com/partdetail/C97996; ComponentLink3Description: LCSC Part URL; ComponentLink3URL: https://lcsc.com/product-detail/Inductors-SMD_Murata-Electronics-Murata-Electronics-LQG15HS1N3S02D_C97996.html
footprint IND-0402 (0402 (1005M) Inductor)
pins: 1, 2

## LQG15HS1N5B02D
designator L?  Inductance: 1.5nH
Inductor, 1.5nH, 70mΩ, 1A, SMD 0402; Manufacturer: Murata Electronics; Manufacturer Part Number: LQG15HS1N5B02D; Self-Resonant Frequency: 6GHz; Q Factor: 8@100MHz; Package Size: 0402; JLCPCB Basic Part: No; JLCPCB Part Number: C340346; Supplier 1: LCSC; Category: Inductors; Supplier Part Number 1: C340346; Rated Current: 1A; DC Resistance: 70mΩ; RoHS: Yes; ComponentLink1Description: Datasheet; ComponentLink1URL: https://wmsc.lcsc.com/wmsc/upload/file/pdf/v2/lcsc/1912111437_Murata-Electronics-LQG15HS1N5B02D_C340346.pdf; ComponentLink2Description: JLCPCB Part URL; ComponentLink2URL: https://jlcpcb.com/partdetail/C340346; ComponentLink3Description: LCSC Part URL; ComponentLink3URL: https://lcsc.com/product-detail/Inductors-SMD_Murata-Electronics-Murata-Electronics-LQG15HS1N5B02D_C340346.html
footprint IND-0402 (0402 (1005M) Inductor)
pins: 1, 2

## LQG15HS1N5S02D
designator L?  Inductance: 1.5nH
Inductor, 1.5nH, 70mΩ, 1A, SMD 0402; Manufacturer: Murata Electronics; Manufacturer Part Number: LQG15HS1N5S02D; Self-Resonant Frequency: 6GHz; Q Factor: 8@100MHz; Package Size: 0402; JLCPCB Basic Part: No; JLCPCB Part Number: C77106; Supplier 1: LCSC; Category: Inductors; Supplier Part Number 1: C77106; Rated Current: 1A; DC Resistance: 70mΩ; RoHS: Yes; ComponentLink1Description: Datasheet; ComponentLink1URL: https://wmsc.lcsc.com/wmsc/upload/file/pdf/v2/lcsc/2304140030_Murata-Electronics-LQG15HS1N5S02D_C77106.pdf; ComponentLink2Description: JLCPCB Part URL; ComponentLink2URL: https://jlcpcb.com/partdetail/C77106; ComponentLink3Description: LCSC Part URL; ComponentLink3URL: https://lcsc.com/product-detail/Inductors-SMD_Murata-Electronics-Murata-Electronics-LQG15HS1N5S02D_C77106.html
footprint IND-0402 (0402 (1005M) Inductor)
pins: 1, 2

## LQG15HS1N6S02D
designator L?  Inductance: 1.6nH
Inductor, 1.6nH, 70mΩ, 1A, SMD 0402; Manufacturer: Murata Electronics; Manufacturer Part Number: LQG15HS1N6S02D; Self-Resonant Frequency: 6GHz; Q Factor: 8@100MHz; Package Size: 0402; JLCPCB Basic Part: No; JLCPCB Part Number: C162539; Supplier 1: LCSC; Category: Inductors; Supplier Part Number 1: C162539; Rated Current: 1A; DC Resistance: 70mΩ; RoHS: Yes; ComponentLink1Description: Datasheet; ComponentLink1URL: https://wmsc.lcsc.com/wmsc/upload/file/pdf/v2/lcsc/2304140030_Murata-Electronics-LQG15HS1N6S02D_C162539.pdf; ComponentLink2Description: JLCPCB Part URL; ComponentLink2URL: https://jlcpcb.com/partdetail/C162539; ComponentLink3Description: LCSC Part URL; ComponentLink3URL: https://lcsc.com/product-detail/Inductors-SMD_Murata-Electronics-Murata-Electronics-LQG15HS1N6S02D_C162539.html
footprint IND-0402 (0402 (1005M) Inductor)
pins: 1, 2

## LQG15HS1N8B02D
designator L?  Inductance: 1.8nH
Inductor, 1.8nH, 80mΩ, 950mA, SMD 0402; Manufacturer: Murata Electronics; Manufacturer Part Number: LQG15HS1N8B02D; Self-Resonant Frequency: 6GHz; Q Factor: 8@100MHz; Package Size: 0402; JLCPCB Basic Part: No; JLCPCB Part Number: C521065; Supplier 1: LCSC; Category: Inductors; Supplier Part Number 1: C521065; Rated Current: 950mA; DC Resistance: 80mΩ; RoHS: Yes; ComponentLink1Description: Datasheet; ComponentLink1URL: https://wmsc.lcsc.com/wmsc/upload/file/pdf/v2/lcsc/2304140030_Murata-Electronics-LQG15HS1N8B02D_C521065.pdf; ComponentLink2Description: JLCPCB Part URL; ComponentLink2URL: https://jlcpcb.com/partdetail/C521065; ComponentLink3Description: LCSC Part URL; ComponentLink3URL: https://lcsc.com/product-detail/Inductors-SMD_Murata-Electronics-Murata-Electronics-LQG15HS1N8B02D_C521065.html
footprint IND-0402 (0402 (1005M) Inductor)
pins: 1, 2

## LQG15HS1N8C02D
designator L?  Inductance: 1.8nH
Inductor, 1.8nH, 80mΩ, 950mA, SMD 0402; Manufacturer: Murata Electronics; Manufacturer Part Number: LQG15HS1N8C02D; Self-Resonant Frequency: 6GHz; Q Factor: 8@100MHz; Package Size: 0402; JLCPCB Basic Part: No; JLCPCB Part Number: C1329841; Supplier 1: LCSC; Category: Inductors; Supplier Part Number 1: C1329841; Rated Current: 950mA; DC Resistance: 80mΩ; RoHS: Yes; ComponentLink1Description: Datasheet; ComponentLink1URL: https://wmsc.lcsc.com/wmsc/upload/file/pdf/v2/lcsc/2304140030_Murata-Electronics-LQG15HS1N8C02D_C1329841.pdf; ComponentLink2Description: JLCPCB Part URL; ComponentLink2URL: https://jlcpcb.com/partdetail/C1329841; ComponentLink3Description: LCSC Part URL; ComponentLink3URL: https://lcsc.com/product-detail/Inductors-SMD_Murata-Electronics-Murata-Electronics-LQG15HS1N8C02D_C1329841.html
footprint IND-0402 (0402 (1005M) Inductor)
pins: 1, 2

## LQG15HS1N8S02D
designator L?  Inductance: 1.8nH
Inductor, 1.8nH, 80mΩ, 950mA, SMD 0402; Manufacturer: Murata Electronics; Manufacturer Part Number: LQG15HS1N8S02D; Self-Resonant Frequency: 6GHz; Q Factor: 8@100MHz; Package Size: 0402; JLCPCB Basic Part: No; JLCPCB Part Number: C77107; Supplier 1: LCSC; Category: Inductors; Supplier Part Number 1: C77107; Rated Current: 950mA; DC Resistance: 80mΩ; RoHS: Yes; ComponentLink1Description: Datasheet; ComponentLink1URL: https://wmsc.lcsc.com/wmsc/upload/file/pdf/v2/lcsc/2304140030_Murata-Electronics-LQG15HS1N8S02D_C77107.pdf; ComponentLink2Description: JLCPCB Part URL; ComponentLink2URL: https://jlcpcb.com/partdetail/C77107; ComponentLink3Description: LCSC Part URL; ComponentLink3URL: https://lcsc.com/product-detail/Inductors-SMD_Murata-Electronics-Murata-Electronics-LQG15HS1N8S02D_C77107.html
footprint IND-0402 (0402 (1005M) Inductor)
pins: 1, 2